# Altium footprint library Adafruit PyGamer1.PcbLib: 42 footprints (part 2 of 3)
Each footprint in its own frame and in the unit in brackets; x right, y up, seen from the top. Pads: shape width x height; smd on the part's side, far side on the other; paste and mask are expansions set on the pad; w line width, h text height; cw(c..) or ccw(c..) is an arc to the next point about the centre after c.
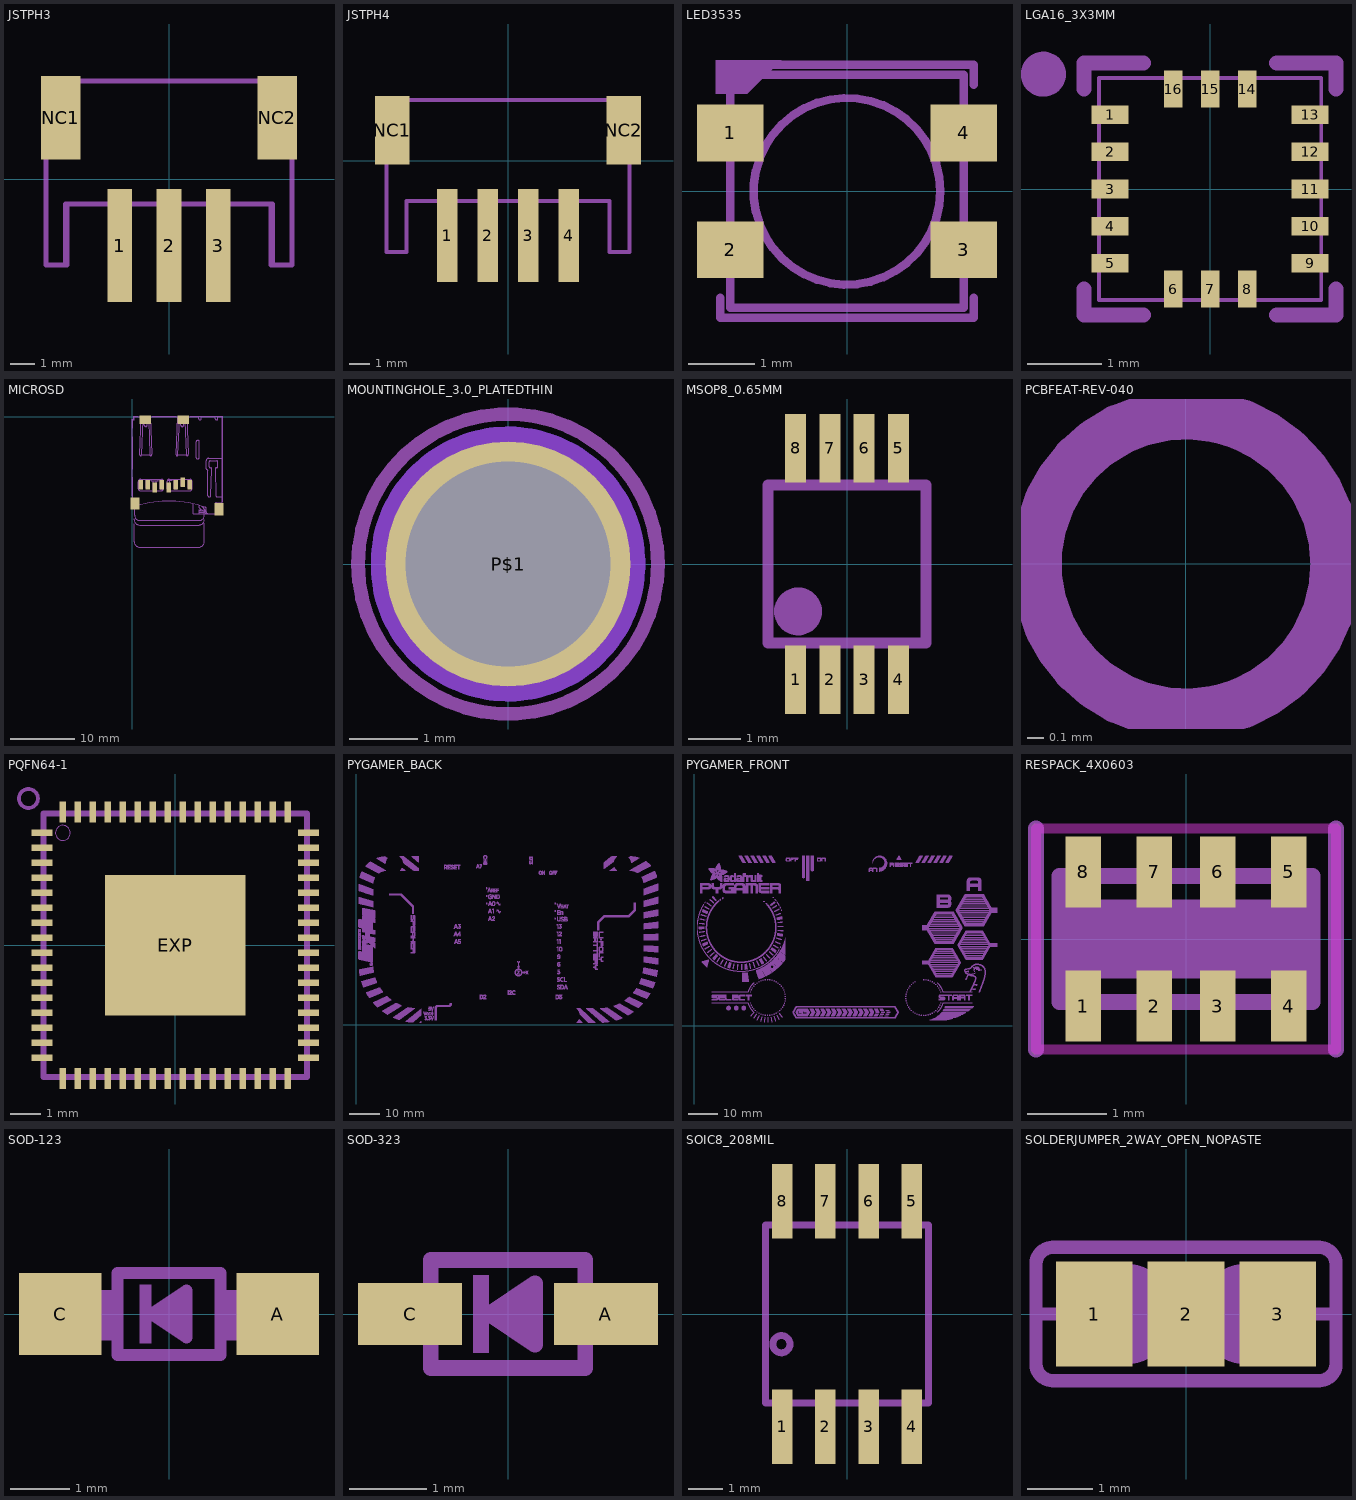
[diagram p1: the footprints below, top view; thin cyan lines are the x and y axes]

## JSTPH3 [mm]
pads (5):
  rect 1x4.6 smd: 1(-2,-2.7) 2(0,-2.7) 3(2,-2.7)
  rect 1.6x3.4 smd: NC1(-4.4,2.5) NC2(4.4,2.5)
Mechanical 3:
  lines w0.203: -5,-3.5 -5,4 5,4 5,-3.5 4.2,-3.5 4.2,-1 -4.2,-1 -4.2,-3.5 -5,-3.5
Mechanical 7:
  lines w0.203: -5,0.5 -5,-3.5 -4.15,-3.5 -4.15,-1 -2.75,-1 ; -3.25,4 3.25,4 ; 0.75,-1 4.15,-1 4.15,-3.5 5,-3.5 5,0.5

## JSTPH4 [mm]
pads (6):
  rect 1x4.6 smd: 1(-3,-3.7) 2(-1,-3.7) 3(1,-3.7) 4(3,-3.7)
  rect 1.7x3.4 smd: NC1(-5.7,1.5) NC2(5.7,1.5)
Mechanical 3:
  lines w0.203: -6,-4.5 -6,3 6,3 6,-4.5 5,-4.5 5,-2 -5,-2 -5,-4.5 -6,-4.5
Mechanical 7:
  lines w0.203: -6,-0.5 -6,-4.5 -5,-4.5 -5,-2 -3.75,-2 ; -4.5,3 4.5,3 ; 3.75,-2 5,-2 5,-4.5 6,-4.5 6,-0.5

## LED3535 [mm]
pads (4):
  rect 1x0.85 smd: 1(-1.75,0.875) 2(-1.75,-0.875) 3(1.75,-0.875) 4(1.75,0.875)
Mechanical 4:
  circle w0.127: c0,0 r1.4
  lines w0.127: -1.75,-1.75 1.75,-1.75 1.75,1.75 -1.75,1.75 -1.75,-1.75
Mechanical 8:
  region: -1.968,1.968 -1.968,1.46 -1.498,1.46 -0.99,1.968
  lines w0.127: -1.9,-1.6 -1.9,-1.9 1.9,-1.9 1.9,-1.6 ; -1.9,1.6 -1.9,1.9 1.9,1.9 1.9,1.6

## LGA16_3X3MM [mm]
pads (16):
  rect 0.5x0.25 smd: 1(-1.35,1) 2(-1.35,0.5) 3(-1.35,0) 4(-1.35,-0.5) 5(-1.35,-1) 9(1.35,-1) 10(1.35,-0.5) 11(1.35,0) 12(1.35,0.5) 13(1.35,1)
  rect 0.25x0.5 smd: 6(-0.5,-1.35) 7(0,-1.35) 8(0.5,-1.35) 14(0.5,1.35) 15(0,1.35) 16(-0.5,1.35)
Mechanical 3:
  lines w0.051: -1.5,-1.5 1.5,-1.5 1.5,1.5 -1.5,1.5 -1.5,-1.5
Mechanical 7:
  circle w0.406: c-2.25,1.55 r0.1
  lines w0.203: -1.7,-1.35 -1.7,-1.7 -0.9,-1.7 ; -1.7,1.35 -1.7,1.7 -0.9,1.7 ; 0.9,-1.7 1.7,-1.7 1.7,-1.35 ; 0.9,1.7 1.7,1.7 1.7,1.35

## MICROSD [mm]
pads (12):
  rect 0.7x1.5 smd: 1(9,-10.64) 2(7.9,-10.24) 3(6.8,-10.64) 4(5.7,-11.04) 5(4.6,-10.64) 6(3.5,-11.04) 7(2.4,-10.64) 8(1.3,-10.64)
  rect 1.8x1.4 smd: CD1(2,-0.44) CD2(8,-0.44)
  rect 1.4x1.9 smd: MT1(0.4,-13.54) MT2(13.6,-14.44)
Mechanical 3:
  drawing of 239 lines, arcs and shapes, not listed
Mechanical 7:
  lines w0.127: -0.05,-12.35 -0.05,-0.4 0.2,-0.4 0.2,0.1 0.85,0.1 ; 3.15,0.1 6.85,0.1 ; 9.1,0.1 14.15,0.1 14.15,-13.25

## MOUNTINGHOLE_3.0_PLATEDTHIN [mm]
pads (1):
  round 3.6 / inner round 0 / far side round 3.6 hole 3: P$1(0,0)
Top Layer keep-out:
  circle w2.032: c0,0 r1
  circle w2.032: c0,0 r1
  circle w2.032: c0,0 r1
Bottom Layer keep-out:
  circle w2.032: c0,0 r1
  circle w2.032: c0,0 r1
Mechanical 7:
  circle w0.2: c0,0 r2.2

## MSOP8_0.65MM [mm]
pads (8):
  rect 0.4x1.3 smd: 1(-0.975,-2.2) 2(-0.325,-2.2) 3(0.325,-2.2) 4(0.975,-2.2) 5(0.975,2.2) 6(0.325,2.2) 7(-0.325,2.2) 8(-0.975,2.2)
Mechanical 3:
  lines w0.127: -1.5,-1.5 -1.5,1.5 ; 1.5,-1.5 1.5,1.5
  lines w0.203: -1.5,-1.5 1.5,-1.5 ; -1.5,1.5 1.5,1.5
Mechanical 7:
  circle w0.61: c-0.93,-0.9 r0.15
  lines w0.203: -1.5,-1.5 -1.5,1.5 ; 1.5,-1.5 1.5,1.5

## PCBFEAT-REV-040 [mm]
Mechanical 7:
  circle w0.305: c0,0 r0.898
  text ">REV" at -0.356,-0.508 h1.57

## PQFN64-1 [mm]
pads (65):
  rect 0.7x0.22 smd: 1(-4.45,3.75) 2(-4.45,3.25) 3(-4.45,2.75) 4(-4.45,2.25) 5(-4.45,1.75) 6(-4.45,1.25) 7(-4.45,0.75) 8(-4.45,0.25) 9(-4.45,-0.25) 10(-4.45,-0.75) 11(-4.45,-1.25) 12(-4.45,-1.75) 13(-4.45,-2.25) 14(-4.45,-2.75) 15(-4.45,-3.25) 16(-4.45,-3.75) 33(4.45,-3.75) 34(4.45,-3.25) 35(4.45,-2.75) 36(4.45,-2.25) 37(4.45,-1.75) 38(4.45,-1.25) 39(4.45,-0.75) 40(4.45,-0.25) 41(4.45,0.25) 42(4.45,0.75) 43(4.45,1.25) 44(4.45,1.75) 45(4.45,2.25) 46(4.45,2.75) 47(4.45,3.25) 48(4.45,3.75)
  rect 0.22x0.7 smd: 17(-3.75,-4.45) 18(-3.25,-4.45) 19(-2.75,-4.45) 20(-2.25,-4.45) 21(-1.75,-4.45) 22(-1.25,-4.45) 23(-0.75,-4.45) 24(-0.25,-4.45) 25(0.25,-4.45) 26(0.75,-4.45) 27(1.25,-4.45) 28(1.75,-4.45) 29(2.25,-4.45) 30(2.75,-4.45) 31(3.25,-4.45) 32(3.75,-4.45) 49(3.75,4.45) 50(3.25,4.45) 51(2.75,4.45) 52(2.25,4.45) 53(1.75,4.45) 54(1.25,4.45) 55(0.75,4.45) 56(0.25,4.45) 57(-0.25,4.45) 58(-0.75,4.45) 59(-1.25,4.45) 60(-1.75,4.45) 61(-2.25,4.45) 62(-2.75,4.45) 63(-3.25,4.45) 64(-3.75,4.45)
  rect 4.7x4.7 smd paste+0: EXP(0,0)
Top Paste:
  region: -1.905,0.381 -1.905,1.905 -0.381,1.905 -0.381,0.381
  region: 0.381,0.381 0.381,1.905 1.905,1.905 1.905,0.381
  region: 0.381,-1.905 0.381,-0.381 1.905,-0.381 1.905,-1.905
  region: -1.905,-1.905 -1.905,-0.381 -0.381,-0.381 -0.381,-1.905
Mechanical 3:
  circle w0: c-3.75,3.75 r0.25
  lines w0.203: -4.4,-4.4 -4.4,4.4 4.4,4.4 4.4,-4.4 -4.4,-4.4
Mechanical 7:
  circle w0.127: c-4.9,4.9 r0.316

## PYGAMER_BACK [mm]
Mechanical90:
  drawing of 21679 lines, arcs and shapes, not listed

## PYGAMER_FRONT [mm]
Mechanical91:
  drawing of 25938 lines, arcs and shapes, not listed

## RESPACK_4X0603 [mm]
pads (8):
  rect 0.45x0.9 smd: 1(-1.3,-0.85) 2(-0.4,-0.85) 3(0.4,-0.85) 4(1.3,-0.85) 5(1.3,0.85) 6(0.4,0.85) 7(-0.4,0.85) 8(-1.3,0.85)
Top Layer keep-out:
  lines w0.127: -1.9,-1.4 -1.9,1.4 1.9,1.4 1.9,-1.4 -1.9,-1.4
Mechanical 3:
  region: -1.55,-0.5 -1.55,0.5 1.55,0.5 1.55,-0.5
  lines w0.203: -1.6,-0.8 1.6,-0.8 1.6,0.8 -1.6,0.8 -1.6,-0.8
Mechanical 7:
  lines w0.203: -1.9,-1.4 -1.9,1.4 ; 1.9,-1.4 1.9,1.4

## SOD-123 [mm]
pads (2):
  rect 1.4x1.4 smd: A(1.85,0) C(-1.85,0)
Mechanical 3:
  region: -1.723,-0.45 -1.723,0.4 -0.973,0.4 -0.973,-0.45
  region: 0.973,-0.45 0.973,0.4 1.723,0.4 1.723,-0.45
  lines w0.203: -0.873,-0.7 -0.873,0.7 ; 0.873,-0.7 0.873,0.7
Mechanical 7:
  region: -0.5,-0.5 -0.5,0.5 -0.3,0.5 -0.3,-0.5
  region: -0.283,0 0.301,0.39 0.301,-0.39
  lines w0.203: -0.873,-0.7 0.873,-0.7 ; -0.873,0.7 0.873,0.7 ; -0.3,0 0.3,0.4 0.3,-0.4 -0.3,0

## SOD-323 [mm]
pads (2):
  rect 1.35x0.8 smd: A(1.27,0) C(-1.27,0)
Mechanical 3:
  lines w0.203: -1,-0.7 -1,0.7 ; 1,-0.7 1,0.7
Mechanical 7:
  region: -0.45,-0.5 -0.45,0.5 -0.25,0.5 -0.25,-0.5
  region: -0.283,0 0.301,0.39 0.301,-0.39
  lines w0.203: -1,-0.7 1,-0.7 ; -1,0.7 1,0.7 ; -0.25,0 0.35,0.4 0.35,-0.4 -0.25,0

## SOIC8_208MIL [mm]
pads (8):
  rect 0.6x2.2 smd: 1(-1.905,-3.315) 2(-0.635,-3.315) 3(0.635,-3.315) 4(1.905,-3.315) 5(1.905,3.315) 6(0.635,3.315) 7(-0.635,3.315) 8(-1.905,3.315)
Mechanical 3:
  region: -2.15,-3.815 -2.15,-2.715 -1.66,-2.715 -1.66,-3.815
  region: -0.88,-3.815 -0.88,-2.715 -0.39,-2.715 -0.39,-3.815
  region: 0.39,-3.815 0.39,-2.715 0.88,-2.715 0.88,-3.815
  region: 1.66,-3.815 1.66,-2.715 2.15,-2.715 2.15,-3.815
  region: 1.66,2.715 1.66,3.815 2.15,3.815 2.15,2.715
  region: 0.39,2.715 0.39,3.815 0.88,3.815 0.88,2.715
  region: -0.88,2.715 -0.88,3.815 -0.39,3.815 -0.39,2.715
  region: -2.15,2.715 -2.15,3.815 -1.66,3.815 -1.66,2.715
  lines w0.203: -2.4,-2.615 2.4,-2.615 2.4,2.615 -2.4,2.615 -2.4,-2.615
Mechanical 7:
  circle w0.203: c-1.93,-0.889 r0.254
  lines w0.203: -2.4,-1.9 -2.4,1.9 ; 2.4,-1.9 2.4,1.9

## SOLDERJUMPER_2WAY_OPEN_NOPASTE [mil]
pads (3):
  rect 46x63 smd paste+0 mask+0: 1(-55,0) 2(0,0) 3(55,0)
Top Solder:
  region: -82,-35 -82,35 82,35 82,-35
Mechanical 3:
  region: -20,-30 -20,30 20,30 20,-30
  lines w8: -85,0 -65,0 ; 65,0 85,0
  lines w50: -35,-5 cw(c-35,0) -35,5 ; 35,-5 ccw(c35,0) 35,5
  text "1" at -130,-25 h77.5
  text "3" at 100,-25 h77.5
Mechanical 7:
  lines w8: -90,-30 ccw(c-80,-30) -80,-40 80,-40 ccw(c80,-30) 90,-30 90,30 ccw(c80,30) 80,40 -80,40 ccw(c-80,30) -90,30 -90,-30